# Altium integrated library passives_ITS_v1.IntLib: 99 symbols
Pins are listed as number, name and electrical type; pins without a type are passive.

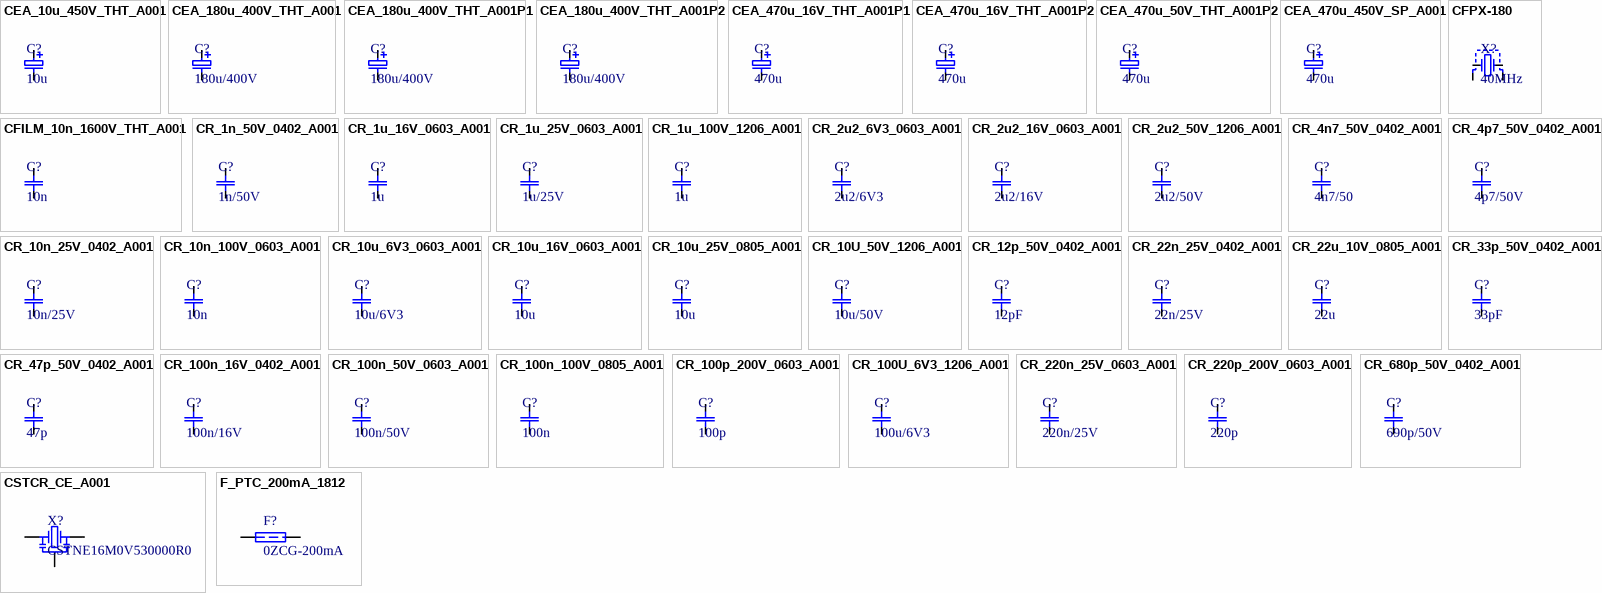
[diagram p0: symbols CEA_10u_450V_THT_A001 to F_PTC_200mA_1812]

## CEA_10u_450V_THT_A001
designator C?, comment 10u
180u/400V Aluminum electrolic R=12.5mm H=20mm e=5mm; ITSN: CEA_10u_450V_THT_A001
footprint CEA_R12,5_H20_A001 (e=5mm fi 12,5mm h 20mm)
pins: 1, 2

## CEA_180u_400V_THT_A001
designator C?, comment 180u/400V
180u/400V Aluminum electrolic R=18mm H=45mm e=7.5mm; ITSN: CEA_180u_400V_THT_A001
footprint CEA_R18H45E7.5_1
pins: 1, 2

## CEA_180u_400V_THT_A001P1
designator C?, comment 180u/400V
180u/400V Aluminum electrolic R=18mm H=45mm e=7.5mm; poziomy prawy; ITSN: CEA_180u_400V_THT_A001P1
footprint CEA_R18H45E7.5_VR_1 (vertival right)
pins: 1, 2

## CEA_180u_400V_THT_A001P2
designator C?, comment 180u/400V
180u/400V Aluminum electrolic R=18mm H=45mm e=7.5mm; poziomy lewy; ITSN: CEA_180u_400V_THT_A001P2
footprint CEA_R18H45E7.5_VL_1 (vertival left)
pins: 1, 2

## CEA_470u_16V_THT_A001P1
designator C?, comment 470u
cap. aluminium 470u/16V THT e=3,5mm H=11mm; ITSN: CEA_470u_16V_THT_A001P1
footprint CEA_R8_H11_5_VL_1 (snap 3.5mm fi 8mm h 11.5mm)
pins: 1, 2

## CEA_470u_16V_THT_A001P2
designator C?, comment 470u
cap. aluminium 470u/16V THT e=3,5mm H=11mm; ITSN: CEA_470u_16V_THT_A001P2
footprint CEA_R8_H11_5_VR_1 (snap 3.5mm fi 8mm h 11.5mm)
pins: 1, 2

## CEA_470u_50V_THT_A001P2
designator C?, comment 470u
cap. aluminium 470u/50V THT e=5mm R=12.5mm H=25mm; ITSN: CEA_470u_50V_THT_A001P1
footprint CEA_R12,5_H25_VL_A001P1 (e=5mm fi 12,5mm h 25mm)
pins: 1, 2

## CEA_470u_450V_SP_A001
designator C?, comment 470u
cap. aluminium 470u/450V THT e=10mm H=50mm; ITSN: CEA_470u_450V_SP_A001
footprint CEA_D35mm_H50mm_SP_A001
pins: 1, 2

## CFILM_10n_1600V_THT_A001
designator C?, comment 10n
10n/1600V MKT Kemet R76 Film capacitor; ITSN: CMKT_10n_1600V_THT_R76_A001
footprint R76-MPK_e15mm_l18mm_t5mm
pins: 1, 2

## CFPX-180
designator X?, comment 40MHz
footprint CFPX-180 (kwarc)
pins: 1, 2, 3, 4

## CR_1n_50V_0402_A001
designator C?, comment 1n/50V
1nF/ 50V X7R 0402; ITSN: CR_1n_50V_X7R_0402_A001
footprint 0402C
pins: 1, 2

## CR_1u_16V_0603_A001
designator C?, comment 1u
1uF/16V X7R 0603; ITSN: CR_1u_16V_X7R_0603_A001
footprint 0603C
pins: 1, 2

## CR_1u_25V_0603_A001
designator C?, comment 1u/25V
1uF/25V X7R 0603; ITSN: CR_1u_25V_X5R_0603_A001
footprint 0603C
pins: 1, 2

## CR_1u_100V_1206_A001
designator C?, comment 1u
1uF/100V X7R 1206; ITSN: CR_1u_100V_X7R_1206_A001
footprint 1206C
pins: 1, 2

## CR_2u2_6V3_0603_A001
designator C?, comment 2u2/6V3
2u2/6V3 X7R 0603; ITSN: CR_2u2_6V3_X7R_0603_A001
footprint 0603C
pins: 1, 2

## CR_2u2_16V_0603_A001
designator C?, comment 2u2/16V
2u2/16V X5R 0603; ITSN: CR_2u2_16V_X5R_0603_A001
footprint 0603C
pins: 1, 2

## CR_2u2_50V_1206_A001
designator C?, comment 2u2/50V
2u2/50V X7R 1206; ITSN: CR_2u2_50V_X7R_1206_A001
footprint 1206C
pins: 1, 2

## CR_4n7_50V_0402_A001
designator C?, comment 4n7/50
4n7 25V X7R 0402; ITSN: CR_4n7_50V_X7R_0402_A001
footprint 0402C
pins: 1, 2

## CR_4p7_50V_0402_A001
designator C?, comment 4p7/50V
4p7F/ 50V X7R 0402; ITSN: CR_4p7_50V_X7R_0402_A001
footprint 0402C
pins: 1, 2

## CR_10n_25V_0402_A001
designator C?, comment 10n/25V
10nF/25V X7R 0402; ITSN: CR_10n_25V_X7R_0402_A001
footprint 0402C
pins: 1, 2

## CR_10n_100V_0603_A001
designator C?, comment 10n
10nF/100V X7R 0603; ITSN: CR_10n_100V_X7R_0603_A001
footprint 0603C
pins: 1, 2

## CR_10u_6V3_0603_A001
designator C?, comment 10u/6V3
10uF/6V3 X7R 0603; ITSN: CR_10u_6V3_X7R_0603_A001
footprint 0603C
pins: 1, 2

## CR_10u_16V_0603_A001
designator C?, comment 10u
10uF/16V X5R 0603; ITSN: CR_10u_16V_X5R_0603_A001
footprint 0603C
pins: 1, 2

## CR_10u_25V_0805_A001
designator C?, comment 10u
10uF/25V X5R 0805; ITSN: CR_10u_25V_X5R_0805_A001
footprint 0805C
pins: 1, 2

## CR_10U_50V_1206_A001
designator C?, comment 10u/50V
10uF/50V X5R 1206; ITSN: CR_10u_50V_X5R_1206_A001
footprint 1206C
pins: 1, 2

## CR_12p_50V_0402_A001
designator C?, comment 12pF
12pF/50V C0G 0402; ITSN: CR_12p_50V_C0G_0402_A001
footprint 0402C
pins: 1, 2

## CR_22n_25V_0402_A001
designator C?, comment 22n/25V
22n/25V X7R 0402; ITSN: CR_22n_25V_X7R_0402_A001
footprint 0402C
pins: 1, 2

## CR_22u_10V_0805_A001
designator C?, comment 22u
22uF/10V X5R 0805; ITSN: CR_22u_10V_X5R_0805_A001
footprint 0805C
pins: 1, 2

## CR_33p_50V_0402_A001
designator C?, comment 33pF
33pF/50V C0G 0402; ITSN: CR_33p_50V_C0G_0402_A001
footprint 0402C
pins: 1, 2

## CR_47p_50V_0402_A001
designator C?, comment 47p
47pF/ 50V C0G 0402; ITSN: CR_47p_50V_C0G_0402_A001
footprint 0402C
pins: 1, 2

## CR_100n_16V_0402_A001
designator C?, comment 100n/16V
100nF/16V X7R 0402; ITSN: CR_100n_16V_X7R_0402_A001
footprint 0402C
pins: 1, 2

## CR_100n_50V_0603_A001
designator C?, comment 100n/50V
100nF/50V X7R 0603; ITSN: CR_100n_50V_X7R_0603_A001
footprint 0603C
pins: 1, 2

## CR_100n_100V_0805_A001
designator C?, comment 100n
100nF/100V X7R 0805; ITSN: CR_100n_100V_X7R_0805_A001
footprint 0805C
pins: 1, 2

## CR_100p_200V_0603_A001
designator C?, comment 100p
100p/200V X7R 0603; ITSN: CR_100p_200V_X7R_0603_A001
footprint 0603C
pins: 1, 2

## CR_100U_6V3_1206_A001
designator C?, comment 100u/6V3
100uF/6V3 X5R 1206; ITSN: CR_100u_6V3_X5R_1206_A001
footprint 1206C
pins: 1, 2

## CR_220n_25V_0603_A001
designator C?, comment 220n/25V
220n/25V X7R 0603; ITSN: CR_220n_25V_X7R_0603_A001
footprint 0603C
pins: 1, 2

## CR_220p_200V_0603_A001
designator C?, comment 220p
220p/200V X7R 0603; ITSN: CR_220p_200V_X7R_0603_A001
footprint 0603C
pins: 1, 2

## CR_680p_50V_0402_A001
designator C?, comment 690p/50V
680pF/ 50V C0G 0402; ITSN: CR_680p_50V_C0G_0402_A001
footprint 0402C
pins: 1, 2

## CSTCR_CE_A001
designator X?, comment CSTNE16M0V530000R0
CSTNE16M0V530000R0 16MHz; ITSN: XTAL_CSTCE_16MHz_SMD_A001
footprint CSTCE_NE_A001 (Murata ceramic resonator e=1,2mm)
pins: 1, 2, 3

## F_PTC_200mA_1812
designator F?, comment 0ZCG-200mA
Polimer PTC fuse 200mA/60V 1812; ITSN: F_POLI_200mA_SMD_1812_A001
footprint 1812F
pins: 1, 2

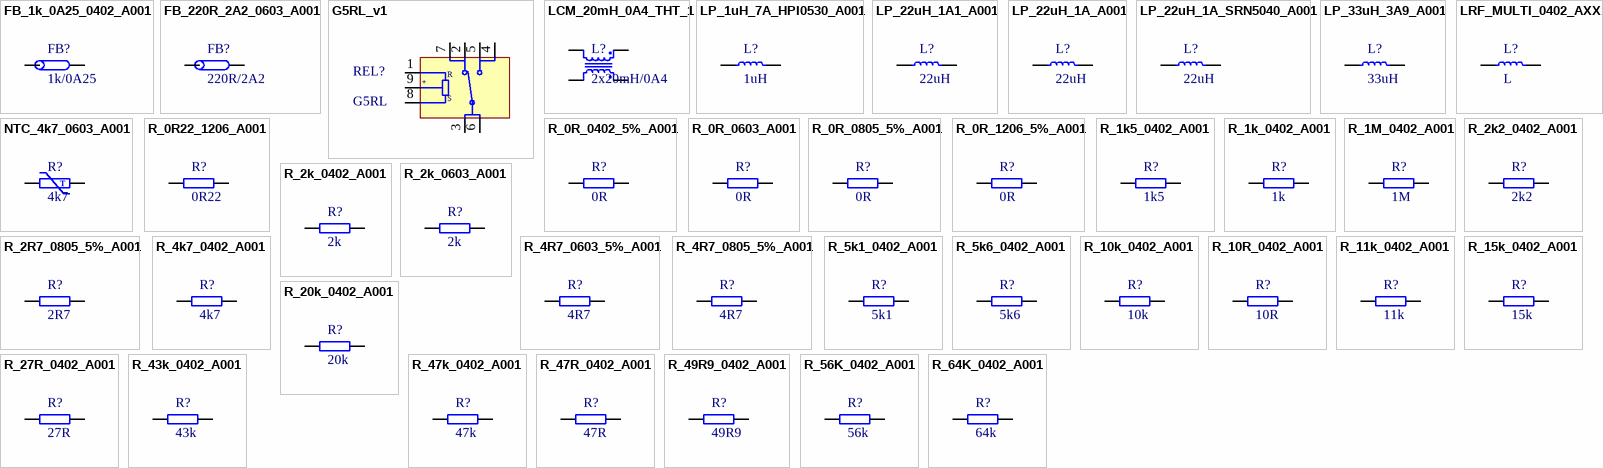
[diagram p1: symbols FB_1k_0A25_0402_A001 to R_64K_0402_A001]

## FB_1k_0A25_0402_A001
designator FB?, comment 1k/0A25
1k @ 100MHz 0A25 0402; ITSN: FB_1k_0A25_0402_A001
footprint 0402R
pins: 1, 2

## FB_220R_2A2_0603_A001
designator FB?, comment 220R/2A2
220R @ 100MHz 0603; ITSN: FB_220R_2A2_0603_A001
footprint 0603R
pins: 1, 2

## G5RL_v1
designator REL?, comment G5RL
bistable releay Omron G5RL; ITSN: REL_G5RL_MULTI_A001
footprint G5RL_universal_v1 (G5RL universal footprint)
pins: 1, 2, 3, 4, 5, 6, 7, 8, 9
text: R; +; S

## LCM_20mH_0A4_THT_1
designator L?, comment 2x20mH/0A4
ITSN: LCM_20mH_0A4_THT_A001
footprint LCM_SSRH7H_B82721-A
pins: 1, 2, 3, 4

## LP_1uH_7A_HPI0530_A001
designator L?, comment 1uH
1uH/7A HPI0530; ITSN: LP_1uH_7A_SMD_HPI0530_A001
footprint HPI0530
pins: 1, 2

## LP_22uH_1A1_A001
designator L?, comment 22uH
22uH/1A1 DJNR 6045; ITSN: LP_22uH_1A1_DJNR6045_A001
footprint DJNR6045
pins: 1, 2

## LP_22uH_1A_A001
designator L?, comment 22uH
22uH/1A DJNR 4018; ITSN: LP_22uH_1A_DJNR4018_A001
footprint DJNR4018
pins: 1, 2

## LP_22uH_1A_SRN5040_A001
designator L?, comment 22uH
22uH/1A SRN5040; DJNR5020; DJNR5040; ITSN: LP_22uH_1A_SRN5040_A001
footprint SRN5040 (BOURNS  SRN5040)
pins: 1, 2

## LP_33uH_3A9_A001
designator L?, comment 33uH
33uH/3A9 DE1207; ITSN: LP_33uH_3A9_DE1207_A001
footprint DE1207
pins: 1, 2

## LRF_MULTI_0402_AXX1
designator L?, comment L
footprint 0402L
pins: 1, 2

## NTC_4k7_0603_A001
designator R?, comment 4k7
NTC 4k7  0603; ITSN: NTC_4k7_0603_A001
footprint 0603R
pins: 1, 2
text: T

## R_0R22_1206_A001
designator R?, comment 0R22
0R22 1% 1206; ITSN: R_0R22_1206_A001
footprint 1206R
pins: 1, 2

## R_0R_0402_5%_A001
designator R?, comment 0R
0R 5% 0402; ITSN: R_0R_5%_0402_A001
footprint 0402R
pins: 1, 2

## R_0R_0603_A001
designator R?, comment 0R
0R 5% 0603; ITSN: R_0R_5%_0603_A001
footprint 0603R
pins: 1, 2

## R_0R_0805_5%_A001
designator R?, comment 0R
0R 5% 0805; ITSN: R_0R_5%_0805_A001
footprint 0805R
pins: 1, 2

## R_0R_1206_5%_A001
designator R?, comment 0R
0R 5% 1206; ITSN: R_0R_5%_1206_A001
footprint 1206R
pins: 1, 2

## R_1k5_0402_A001
designator R?, comment 1k5
1k5 1% 0402; ITSN: R_1k5_1%_0402_A001
footprint 0402R
pins: 1, 2

## R_1k_0402_A001
designator R?, comment 1k
1k 1% 0402; ITSN: R_1k_1%_0402_A001
footprint 0402R
pins: 1, 2

## R_1M_0402_A001
designator R?, comment 1M
1M 1% 0402; ITSN: R_1M_1%_0402_A001
footprint 0402R
pins: 1, 2

## R_2k2_0402_A001
designator R?, comment 2k2
2k2 1% 0402; ITSN: R_2k2_1%_0402_A001
footprint 0402R
pins: 1, 2

## R_2k_0402_A001
designator R?, comment 2k
2k 1% 0402; ITSN: R_2k_1%_0402_A001
footprint 0402R
pins: 1, 2

## R_2k_0603_A001
designator R?, comment 2k
2k 1% 0603; ITSN: R_2k_1%_0603_A001
footprint 0603R
pins: 1, 2

## R_2R7_0805_5%_A001
designator R?, comment 2R7
2R7 5% 0805; ITSN: R_2R7_5%_0805_A001
footprint 0805R
pins: 1, 2

## R_4k7_0402_A001
designator R?, comment 4k7
4k7 1% 0402; ITSN: R_4k7_1%_0402_A001
footprint 0402R
pins: 1, 2

## R_4R7_0603_5%_A001
designator R?, comment 4R7
4R7 5% 0603; ITSN: R_4R7_5%_0603_A001
footprint 0603R
pins: 1, 2

## R_4R7_0805_5%_A001
designator R?, comment 4R7
4R7 5% 0805; ITSN: R_4R7_5%_0805_A001
footprint 0805R
pins: 1, 2

## R_5k1_0402_A001
designator R?, comment 5k1
5k1 1% 0402; ITSN: R_5k1_1%_0402_A001
footprint 0402R
pins: 1, 2

## R_5k6_0402_A001
designator R?, comment 5k6
5k6 1% 0402; ITSN: R_5k6_1%_0402_A001
footprint 0402R
pins: 1, 2

## R_10k_0402_A001
designator R?, comment 10k
10k 1% 0402; ITSN: R_10k_1%_0402_A001
footprint 0402R
pins: 1, 2

## R_10R_0402_A001
designator R?, comment 10R
10R 1% 0402; ITSN: R_10R_1%_0402_A001
footprint 0402R
pins: 1, 2

## R_11k_0402_A001
designator R?, comment 11k
11k 1% 0402; ITSN: R_11k_1%_0402_A001
footprint 0402R
pins: 1, 2

## R_15k_0402_A001
designator R?, comment 15k
15k 1% 0402; ITSN: R_15k_1%_0402_A001
footprint 0402R
pins: 1, 2

## R_20k_0402_A001
designator R?, comment 20k
20k 1% 0402; ITSN: R_20k_1%_0402_A001
footprint 0402R
pins: 1, 2

## R_27R_0402_A001
designator R?, comment 27R
27R 1% 0402; ITSN: R_27R_1%_0402_A001
footprint 0402R
pins: 1, 2

## R_43k_0402_A001
designator R?, comment 43k
43k 1% 0402; ITSN: R_43k_1%_0402_A001
footprint 0402R
pins: 1, 2

## R_47k_0402_A001
designator R?, comment 47k
47k 1% 0402; ITSN: R_47k_1%_0402_A001
footprint 0402R
pins: 1, 2

## R_47R_0402_A001
designator R?, comment 47R
47R 1% 0402; ITSN: R_47R_1%_0402_A001
footprint 0402R
pins: 1, 2

## R_49R9_0402_A001
designator R?, comment 49R9
49R9 1% 0402; ITSN: R_49R9_1%_0402_A001
footprint 0402R
pins: 1, 2

## R_56K_0402_A001
designator R?, comment 56k
56k 1% 0402; ITSN: R_56K_1%_0402_A001
footprint 0402R
pins: 1, 2

## R_64K_0402_A001
designator R?, comment 64k
64k 1% 0402; ITSN: R_64k_1%_0402_A001
footprint 0402R
pins: 1, 2

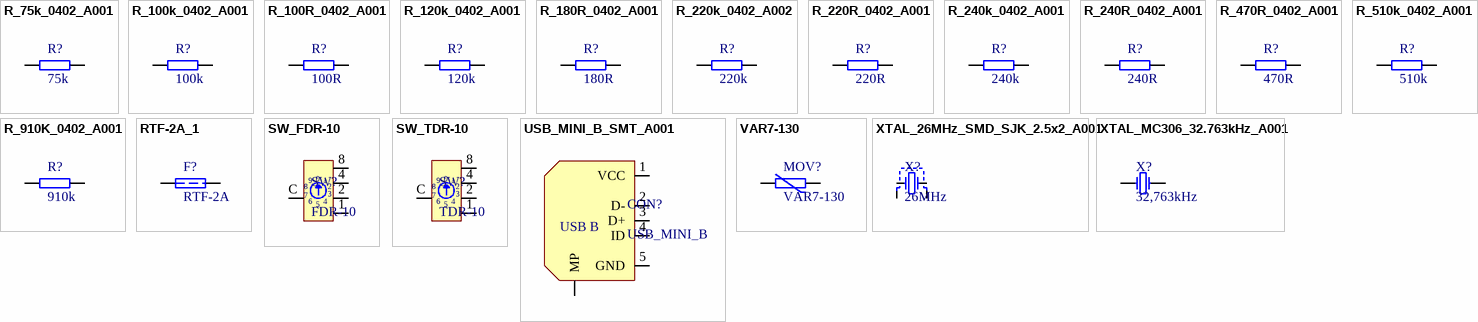
[diagram p2: symbols R_75k_0402_A001 to XTAL_MC306_32.763kHz_A001]

## R_75k_0402_A001
designator R?, comment 75k
75k 1% 0402; ITSN: R_75k_1%_0402_A001
footprint 0402R
pins: 1, 2

## R_100k_0402_A001
designator R?, comment 100k
100k 1% 0402; ITSN: R_100k_1%_0402_A001
footprint 0402R
pins: 1, 2

## R_100R_0402_A001
designator R?, comment 100R
100R 1% 0402; ITSN: R_100R_1%_0402_A001
footprint 0402R
pins: 1, 2

## R_120k_0402_A001
designator R?, comment 120k
120k 1% 0402; ITSN: R_120k_1%_0402_A001
footprint 0402R
pins: 1, 2

## R_180R_0402_A001
designator R?, comment 180R
180R 1% 0402; ITSN: R_180R_1%_0402_A001
footprint 0402R
pins: 1, 2

## R_220k_0402_A002
designator R?, comment 220k
220k 1% 0402; ITSN: R_220k_1%_0402_A001
footprint 0402R
pins: 1, 2

## R_220R_0402_A001
designator R?, comment 220R
220R 1% 0402; ITSN: R_220R_1%_0402_A001
footprint 0402R
pins: 1, 2

## R_240k_0402_A001
designator R?, comment 240k
240k 1% 0402; ITSN: R_240k_1%_0402_A001
footprint 0402R
pins: 1, 2

## R_240R_0402_A001
designator R?, comment 240R
240R 1% 0402; ITSN: R_240R_1%_0402_A001
footprint 0402R
pins: 1, 2

## R_470R_0402_A001
designator R?, comment 470R
470R 1% 0402; ITSN: R_470R_1%_0402_A001
footprint 0402R
pins: 1, 2

## R_510k_0402_A001
designator R?, comment 510k
510k 1% 0402; ITSN: R_510k_1%_0402_A001
footprint 0402R
pins: 1, 2

## R_910K_0402_A001
designator R?, comment 910k
910k 1% 0402; ITSN: R_910k_1%_0402_A001
footprint 0402R
pins: 1, 2

## RTF-2A_1
designator F?, comment RTF-2A
ITSN: FUSE_2A_RAD_THT_8MM_A001
footprint FUSE_MRT_THT_v1 (MRT round fuse THT soldering)
pins: 1, 2

## SW_FDR-10
designator SW?, comment FDR-10
rotary dip switch 10 pole; ITSN: SW_FDR_10_THT_A001
footprint FDR-10 (rotary dip switch)
pins: 1, 2, 4, 8, C
text: 0; 9; 3; 7; 6; 5

## SW_TDR-10
designator SW?, comment TDR-10
rotary dip switch 10 pole; ITSN: SW_TDR_10_THT_A001
footprint TDR-10 (rotary dip switch)
pins: 1, 2, 4, 8, C
text: 0; 9; 3; 7; 6; 5

## USB_MINI_B_SMT_A001
designator CON?, comment USB_MINI_B
USB mini B AMPHENOL: 10033526-N3212MLF or MOLEX:67503-1020; ITSN: CON_USB_MINIB_SMD_A001
footprint USB_MINI_B_SMT_1
pins: 1 VCC, 2 D-, 3 D+, 4 ID, 5 GND, MP1 MP
text: USB B

## VAR7-130
designator MOV?
MOV 130V 1,2kA, 240pF; ITSN: MOV_130V_1k2A_THT_A001
footprint WE-VD_Varistor_5mm (WE-VD Disk Varistor 5mm)
pins: 1, 2

## XTAL_26MHz_SMD_SJK_2.5x2_A001
designator X?, comment 26MHz
ITSN: XTAL_26MHz_SMD_SJK_2.5x2_A001
footprint SJK_2_5x2_A001 (XTAL)
pins: 1, 2, 3, 4

## XTAL_MC306_32.763kHz_A001
designator X?, comment 32,763kHz
EPSON MC306 32.768000KHZ 12.5PF; ITSN: XTAL_MC306_32.763kHz_A001
footprint MC-306
pins: 1, 2